# Altium integrated library Connector-SIL-THP.IntLib: 464 symbols (part 1 of 2)
Pins are listed as number, name and electrical type; pins without a type are passive.

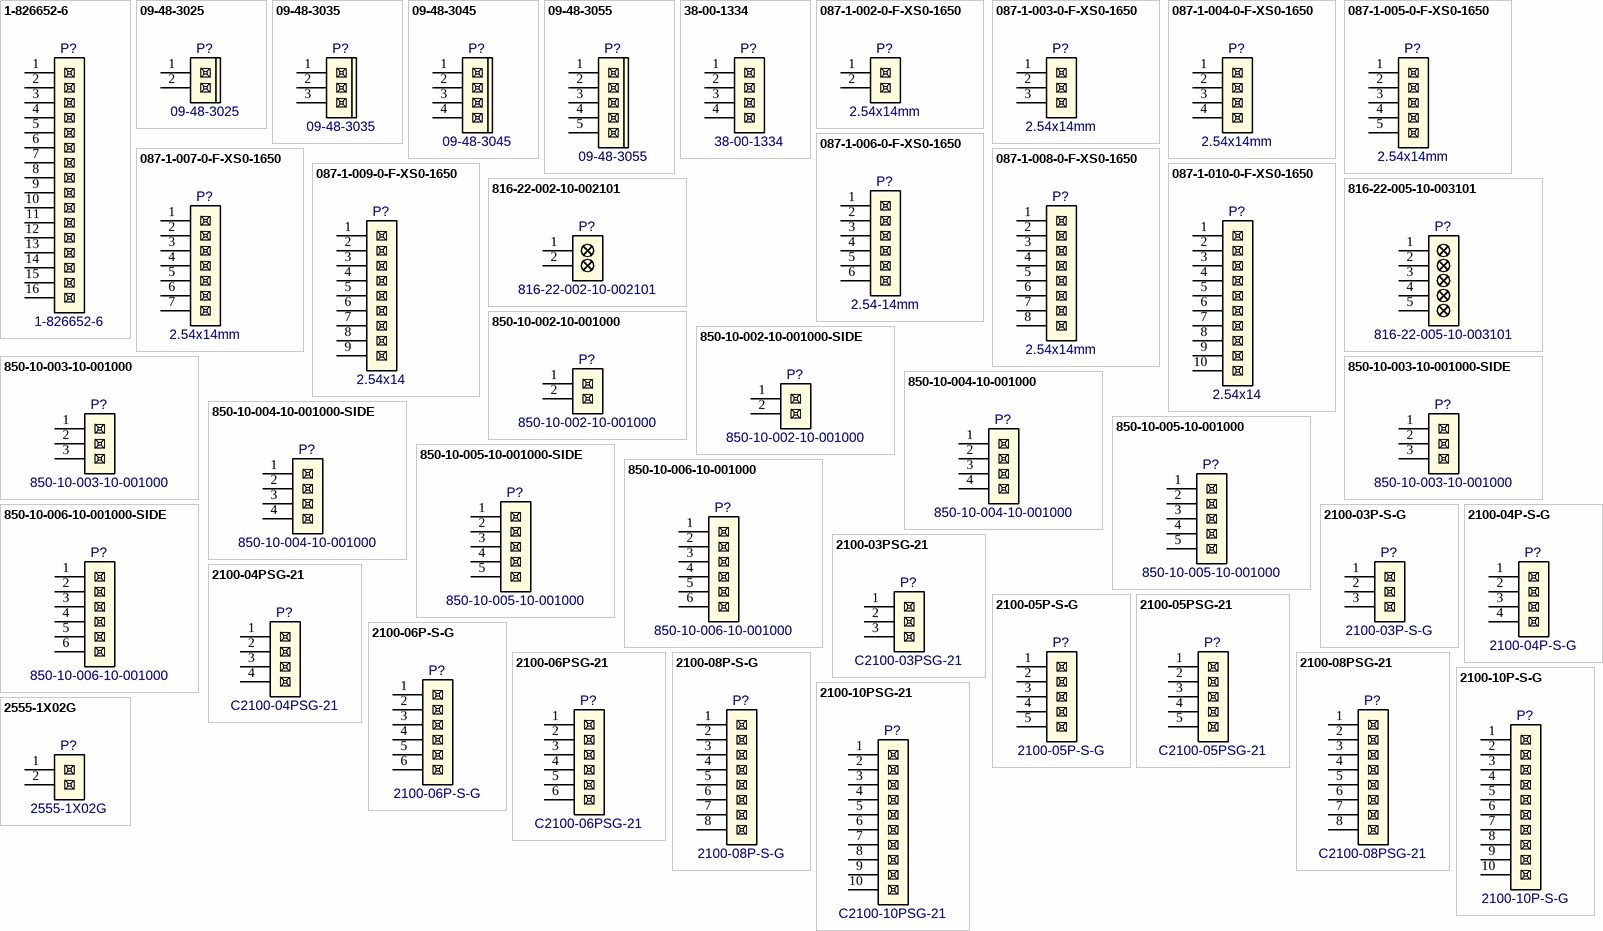
[diagram p0: symbols 1-826652-6 to 2555-1X02G]

## 1-826652-6
designator P?
Header SIL Male THP, 2.54mm Pitch Rt Angle; Manufacturer: Tyco; Package: 1-826652-6; EDM-PN: *; Text2: *; Text1: *; Value: 1-826652-6; SAAB PN: *; Part Number: 1-826652-6
footprint 1-826652-6 (1-826652-6 Rt Angle 2.54mm)
pins: 1, 2, 3, 4, 5, 6, 7, 8, 9, 10, 11, 12, 13, 14, 15, 16

## 09-48-3025
designator P?
Connector Board Edge Rt Angle 3.96mm; Manufacturer: Molex; Package: M41815-02-RT; EDM-PN: *; Text2: *; Text1: *; Part Number: 09-48-3025; SAAB PN: *; Value: 09-48-3025
footprint M41815-02-RT (M41815 3.96mm)
pins: 1, 2

## 09-48-3035
designator P?
Connector Board Edge Rt Angle 3.96mm; Manufacturer: Molex; Package: M41815-03-RT; EDM-PN: *; Text2: *; Text1: *; Part Number: 09-48-3035; Value: 09-48-3035; SAAB PN: *
footprint M41815-03-RT (M41815 3.96mm)
pins: 1, 2, 3

## 09-48-3045
designator P?
Connector Board Edge Rt Angle 3.96mm; Manufacturer: Molex; Package: M41815-04-RT; EDM-PN: *; Text2: *; Text1: *; Part Number: 09-48-3045; SAAB PN: *; Value: 09-48-3045
footprint M41815-04-RT (M41815 3.96mm)
pins: 1, 2, 3, 4

## 09-48-3055
designator P?
Connector Board Edge Rt Angle 3.96mm; Manufacturer: Molex; Package: M41815-05-RT; EDM-PN: *; Text2: *; Text1: *; Part Number: 09-48-3055; SAAB PN: *; Value: 09-48-3055
footprint M41815-05-RT (M41815 3.96mm)
pins: 1, 2, 3, 4, 5

## 38-00-1334
designator P?
Header SIL 2.54mm Rt Angle Cat Ear Terminals; Manufacturer: Molex; Package: 4455-04; EDM-PN: *; Text2: *; Text1: *; Part Number: 38-00-1334; Value: 38-00-1334; SAAB PN: *
footprint 4455-04 (4455-04 10.06x7.9mm)
pins: 1, 2, 3, 4

## 087-1-002-0-F-XS0-1650
designator P?  value 2.54x14mm  (hidden comment: 087-1-002-0-F-XS0-1650)
Header SIL Male THP, 2.54mm Pitch; Manufacturer: MPE-Garry/Actum; EDM-PN: CON1717; Package: SIL2P-2.54-14mm; Text2: *; Text1: *; SAAB PN: *; Part Number: 087-1-002-0-F-XS0-1650
footprint SIL2P-2.54-14mm (SIL Strip 2.54mm)
pins: 1, 2

## 087-1-003-0-F-XS0-1650
designator P?  value 2.54x14mm  (hidden comment: 087-1-003-0-F-XS0-1650)
Header SIL Male THP, 2.54mm Pitch; Manufacturer: MPE-Garry/Actum; EDM-PN: CON1732; Package: SIL3P-2.54-14mm; Text2: *; Text1: *; SAAB PN: *; Part Number: 087-1-003-0-F-XS0-1650
footprint SIL3P-2.54-14mm (SIL Strip 2.54mm)
pins: 1, 2, 3

## 087-1-004-0-F-XS0-1650
designator P?  value 2.54x14mm  (hidden comment: 087-1-004-0-F-XS0-1650)
Header SIL Male THP, 2.54mm Pitch; Manufacturer: MPE-Garry/Actum; Package: SIL4P-2.54-14mm; EDM-PN: *; Text2: *; Text1: *; Part Number: 087-1-004-0-F-XS0-1650; SAAB PN: *
footprint SIL4P-2.54-14mm (SIL Strip 2.54mm)
pins: 1, 2, 3, 4

## 087-1-005-0-F-XS0-1650
designator P?  value 2.54x14mm  (hidden comment: 087-1-005-0-F-XS0-1650)
Header SIL Male THP, 2.54mm Pitch; Manufacturer: MPE-Garry/Actum; Package: SIL5P-2.54-14mm; EDM-PN: *; Text2: *; Text1: *; SAAB PN: *; Part Number: 087-1-005-0-F-XS0-1650
footprint SIL5P-2.54-14mm (SIL Strip 2.54mm)
pins: 1, 2, 3, 4, 5

## 087-1-006-0-F-XS0-1650
designator P?  value 2.54-14mm  (hidden comment: 087-1-006-0-F-XS0-1650)
Header SIL Male THP, 2.54mm Pitch; Manufacturer: MPE-Garry/Actum; Package: SIL6P-2.54-14mm; EDM-PN: *; Text2: *; Text1: *; SAAB PN: *; Part Number: 087-1-006-0-F-XS0-1650
footprint SIL6P-2.54-14mm (SIL Strip 2.54mm)
pins: 1, 2, 3, 4, 5, 6

## 087-1-007-0-F-XS0-1650
designator P?  value 2.54x14mm  (hidden comment: 087-1-007-0-F-XS0-1650)
Header SIL Male THP, 2.54mm Pitch; Manufacturer: MPE-Garry/Actum; Package: SIL7P-2.54-14mm; EDM-PN: *; Text2: *; Text1: *; SAAB PN: *; Part Number: 087-1-007-0-F-XS0-1650
footprint SIL7P-2.54-14mm (SIL Strip 2.54mm)
pins: 1, 2, 3, 4, 5, 6, 7

## 087-1-008-0-F-XS0-1650
designator P?  value 2.54x14mm  (hidden comment: 087-1-008-0-F-XS0-1650)
Header SIL Male THP, 2.54mm Pitch; Manufacturer: MPE-Garry/Actum; Package: SIL8P-2.54-14mm; EDM-PN: *; Text2: *; Text1: *; SAAB PN: *; Part Number: 087-1-008-0-F-XS0-1650
footprint SIL8P-2.54-14mm (SIL Strip 2.54mm)
pins: 1, 2, 3, 4, 5, 6, 7, 8

## 087-1-009-0-F-XS0-1650
designator P?  value 2.54x14  (hidden comment: 087-1-009-0-F-XS0-1650)
Header SIL Male THP, 2.54mm Pitch; Manufacturer: MPE-Garry/Actum; Package: SIL9P-2.54-14; EDM-PN: *; Text2: *; Text1: *; SAAB PN: *; Part Number: 087-1-009-0-F-XS0-1650
footprint SIL9P-2.54-14mm (SIL Strip 2.54mm)
pins: 1, 2, 3, 4, 5, 6, 7, 8, 9

## 087-1-010-0-F-XS0-1650
designator P?  value 2.54x14  (hidden comment: 087-1-010-0-F-XS0-1650)
Header SIL Male THP, 2.54mm Pitch; Manufacturer: MPE-Garry/Actum; Package: SIL10P-2.54-14mm; EDM-PN: *; Text2: *; Text1: *; SAAB PN: *; Part Number: 087-1-010-0-F-XS0-1650
footprint SIL10P-2.54-14mm (SIL Strip 2.54mm)
pins: 1, 2, 3, 4, 5, 6, 7, 8, 9, 10

## 816-22-002-10-002101
designator P?
Connector Spring-Loaded; Manufacturer: Mill-Max; Package: 816-22-002-10-002101; EDM-PN: *; Text2: *; Text1: *; Part Number: 816-22-002-10-002101; SAAB PN: *; Value: 816-22-002-10-002101
footprint 816-22-002-10-002101
pins: 1, 2

## 816-22-005-10-003101
designator P?
Connector Spring-Loaded; Manufacturer: Mill-Max; Package: 816-22-005-10-003101; EDM-PN: *; Text2: *; Text1: *; Part Number: 816-22-005-10-003101; SAAB PN: *; Value: 816-22-005-10-003101
footprint 816-22-005-10-003101 (816-22-005-10-003101 2.54mm)
pins: 1, 2, 3, 4, 5

## 850-10-002-10-001000
designator P?
Header SIL Male THP, 1.27mm Pitch; Manufacturer: Mill-Max; Package: 850-10-002-10-001000; EDM-PN: *; Text2: *; Text1: *; Value: 850-10-002-10-001000; SAAB PN: *; Part Number: 850-10-002-10-001000
footprint 850-10-002-10-001000 (850-10-002-10-001000 1.27mm)
pins: 1, 2

## 850-10-002-10-001000-SIDE
designator P?  Part Number: 850-10-002-10-001000  (hidden comment: 850-10-002-10-001000-SIDE)
Header SIL Male THP, 1.27mm Pitch; Manufacturer: Mill-Max; Package: 850-10-002-10-001000-SIDE; EDM-PN: *; Text2: *; Text1: *; Value: 850-10-002-10-001000; SAAB PN: *
footprint 850-10-002-10-001000-Side (850-10-002-10-001000 1.27mm)
pins: 1, 2

## 850-10-003-10-001000
designator P?
Header SIL Male THP, 1.27mm Pitch; Manufacturer: mill-Max; Package: 850-10-003-10-001000; EDM-PN: *; Text2: *; Text1: *; Value: 850-10-003-10-001000; SAAB PN: *; Part Number: 850-10-003-10-001000
footprint 850-10-003-10-001000 (850-10-003-10-001000 1.27mm)
pins: 1, 2, 3

## 850-10-003-10-001000-SIDE
designator P?  Part Number: 850-10-003-10-001000  (hidden comment: 850-10-003-10-001000-SIDE)
Header SIL Male THP, 1.27mm Pitch; Manufacturer: Mill-Max; Package: 850-10-003-10-001000-SIDE; EDM-PN: *; Text2: *; Text1: *; Value: 850-10-003-10-001000; SAAB PN: *
footprint 850-10-003-10-001000-Side (850-10-003-10-001000 1.27mm)
pins: 1, 2, 3

## 850-10-004-10-001000
designator P?
Header SIL Male THP, 1.27mm Pitch; Manufacturer: Mill-Max; Package: 850-10-004-10-001000; EDM-PN: *; Text2: *; Text1: *; Value: 850-10-004-10-001000; Part Number: 850-10-004-10-001000; SAAB PN: *
footprint 850-10-004-10-001000 (850-10-004-10-001000 1.27mm)
pins: 1, 2, 3, 4

## 850-10-004-10-001000-SIDE
designator P?  Part Number: 850-10-004-10-001000  (hidden comment: 850-10-004-10-001000-SIDE)
Header SIL Male THP, 1.27mm Pitch; Manufacturer: Mill-Max; Package: 850-10-004-10-001000-SIDE; EDM-PN: *; Text2: *; Text1: *; Value: 850-10-004-10-001000; SAAB PN: *
footprint 850-10-004-10-001000-Side (850-10-004-10-001000 1.27mm)
pins: 1, 2, 3, 4

## 850-10-005-10-001000
designator P?
Header SIL Male THP, 1.27mm Pitch; Manufacturer: Mill-Max; Package: 850-10-005-10-001000; EDM-PN: *; Text2: *; Text1: *; Value: 850-10-005-10-001000; SAAB PN: *; Part Number: 850-10-005-10-001000
footprint 850-10-005-10-001000 (850-10-005-10-001000 1.27mm)
pins: 1, 2, 3, 4, 5

## 850-10-005-10-001000-SIDE
designator P?  Part Number: 850-10-005-10-001000  (hidden comment: 850-10-005-10-001000-SIDE)
Header SIL Male THP, 1.27mm Pitch; Manufacturer: Mill-Max; Package: 850-10-005-10-001000-SIDE; EDM-PN: *; Text2: *; Text1: *; Value: 850-10-005-10-001000; SAAB PN: *
footprint 850-10-005-10-001000-Side (850-10-005-10-001000 1.27mm)
pins: 1, 2, 3, 4, 5

## 850-10-006-10-001000
designator P?
Header SIL Male THP, 1.27mm Pitch; Manufacturer: Mill-Max; Package: 850-10-006-10-001000; EDM-PN: *; Text2: *; Text1: *; Value: 850-10-006-10-001000; Part Number: 850-10-006-10-001000; SAAB PN: *
footprint 850-10-006-10-001000 (850-10-006-10-001000 1.27mm)
pins: 1, 2, 3, 4, 5, 6

## 850-10-006-10-001000-SIDE
designator P?  Part Number: 850-10-006-10-001000  (hidden comment: 850-10-006-10-001000-SIDE)
Header SIL Male THP, 1.27mm Pitch; Manufacturer: Mill-Max; Package: 850-10-006-10-001000-SIDE; EDM-PN: *; Text2: *; Text1: *; Value: 850-10-006-10-001000; SAAB PN: *
footprint 850-10-006-10-001000-Side (850-10-006-10-001000 1.27mm)
pins: 1, 2, 3, 4, 5, 6

## 2100-03P-S-G
designator P?
Header SIL Male THP, 2.54mm Pitch; Manufacturer: Vesik; SAAB PN: 1ANA00301AEA; Package: SIL3P-2.54; EDM-PN: *; Text2: *; Text1: *; Value: 2100-03P-S-G; Part Number: 2100-03P-S-G
footprint SIL3P-2.54 (SIL Strip 2.54mm)
pins: 1, 2, 3

## 2100-03PSG-21
designator P?  Part Number: C2100-03PSG-21  (hidden comment: 2100-03PSG-21)
Header SIL Male THP, 2.54mm Pitch; Manufacturer: BVH/Hsuan Mao Technology; Package: 2100-03PSG-21; EDM-PN: *; Text2: *; Text1: *; Value: 2100-03PSG-21; SAAB PN: *
footprint 2100-03PSG-21 (SIL Strip 2.54mm)
pins: 1, 2, 3

## 2100-04P-S-G
designator P?
Header SIL Male THP, 2.54mm Pitch; Manufacturer: Vensik; Package: SIL4P-2.54; EDM-PN: *; Text2: *; Text1: *; Value: 2100-04P-S-G; SAAB PN: *; Part Number: 2100-04P-S-G
footprint SIL4P-2.54 (SIL Strip 2.54mm)
pins: 1, 2, 3, 4

## 2100-04PSG-21
designator P?  Part Number: C2100-04PSG-21  (hidden comment: 2100-04PSG-21)
Header SIL Male THP, 2.54mm Pitch; Manufacturer: BVH/Hsuan Mao Technology; Package: 2100-04PSG-21; EDM-PN: *; Text2: *; Text1: *; Value: 2100-04PSG-21; SAAB PN: *
footprint 2100-04PSG-21 (SIL Strip 2.54mm)
pins: 1, 2, 3, 4

## 2100-05P-S-G
designator P?
Header SIL Male THP, 2.54mm Pitch; Manufacturer: Vensik; Package: SIL5P-2.54; EDM-PN: *; Text2: *; Text1: *; Value: 2100-05P-S-G; SAAB PN: *; Part Number: 2100-05P-S-G
footprint SIL5P-2.54 (SIL Strip 2.54mm)
pins: 1, 2, 3, 4, 5

## 2100-05PSG-21
designator P?  Part Number: C2100-05PSG-21  (hidden comment: 2100-05PSG-21)
Header SIL Male THP, 2.54mm Pitch; Manufacturer: BVH/Hsuan Mao Technology; Package: 2100-05PSG-21; EDM-PN: *; Text2: *; Text1: *; Value: 2100-05PSG-21; SAAB PN: *
footprint 2100-05PSG-21 (SIL Strip 2.54mm)
pins: 1, 2, 3, 4, 5

## 2100-06P-S-G
designator P?
Header SIL Male THP, 2.54mm Pitch; Manufacturer: Vensik; Package: SIL6P-2.54; EDM-PN: *; Text2: *; Text1: *; Value: 2100-06P-S-G; SAAB PN: *; Part Number: 2100-06P-S-G
footprint SIL6P-2.54 (SIL Strip 2.54mm)
pins: 1, 2, 3, 4, 5, 6

## 2100-06PSG-21
designator P?  Part Number: C2100-06PSG-21  (hidden comment: 2100-06PSG-21)
Header SIL Male THP, 2.54mm Pitch; Manufacturer: BVH/Hsuan Mao Technology; Package: 2100-06PSG-21; EDM-PN: *; Text2: *; Text1: *; Value: 2100-06PSG-21; SAAB PN: *
footprint 2100-06PSG-21 (SIL Strip 2.54mm)
pins: 1, 2, 3, 4, 5, 6

## 2100-08P-S-G
designator P?
Header SIL Male THP, 2.54mm Pitch; Manufacturer: Vensik; Package: SIL8P-2.54; EDM-PN: *; Text2: *; Text1: *; Value: 2100-08P-S-G; SAAB PN: *; Part Number: 2100-08P-S-G
footprint SIL8P-2.54 (SIL Strip 2.54mm)
pins: 1, 2, 3, 4, 5, 6, 7, 8

## 2100-08PSG-21
designator P?  Part Number: C2100-08PSG-21  (hidden comment: 2100-08PSG-21)
Header SIL Male THP, 2.54mm Pitch; Manufacturer: BVH/Hsuan Mao Technology; Package: 2100-08PSG-21; EDM-PN: *; Text2: *; Text1: *; Value: 2100-08PSG-21; SAAB PN: *
footprint 2100-08PSG-21 (SIL Strip 2.54mm)
pins: 1, 2, 3, 4, 5, 6, 7, 8

## 2100-10P-S-G
designator P?
Header SIL Male THP, 2.54mm Pitch; Manufacturer: Vensik; Package: SIL10P-2.54; EDM-PN: *; Text2: *; Text1: *; Value: 2100-10P-S-G; SAAB PN: *; Part Number: 2100-10P-S-G
footprint SIL10P-2.54 (SIL Strip 2.54mm)
pins: 1, 2, 3, 4, 5, 6, 7, 8, 9, 10

## 2100-10PSG-21
designator P?  Part Number: C2100-10PSG-21  (hidden comment: 2100-10PSG-21)
Header SIL Male THP, 2.54mm Pitch; Manufacturer: BVH/Hsuan Mao Technology; Package: 2100-10PSG-21; EDM-PN: *; Text2: *; Text1: *; Value: 2100-10PSG-21; SAAB PN: *
footprint 2100-10PSG-21 (SIL Strip 2.54mm)
pins: 1, 2, 3, 4, 5, 6, 7, 8, 9, 10

## 2555-1X02G
designator P?
Header SIL 2.54mm Female Rt Angle; Manufacturer: Ho Chien; Package: 2555-1X02G; EDM-PN: *; Text2: *; Text1: *; Part Number: 2555-1X02G; SAAB PN: *; Value: 2555-1X02G
footprint 2555-1X02G (2555-1X02G 5.08x8.5mm 2.54mm)
pins: 1, 2

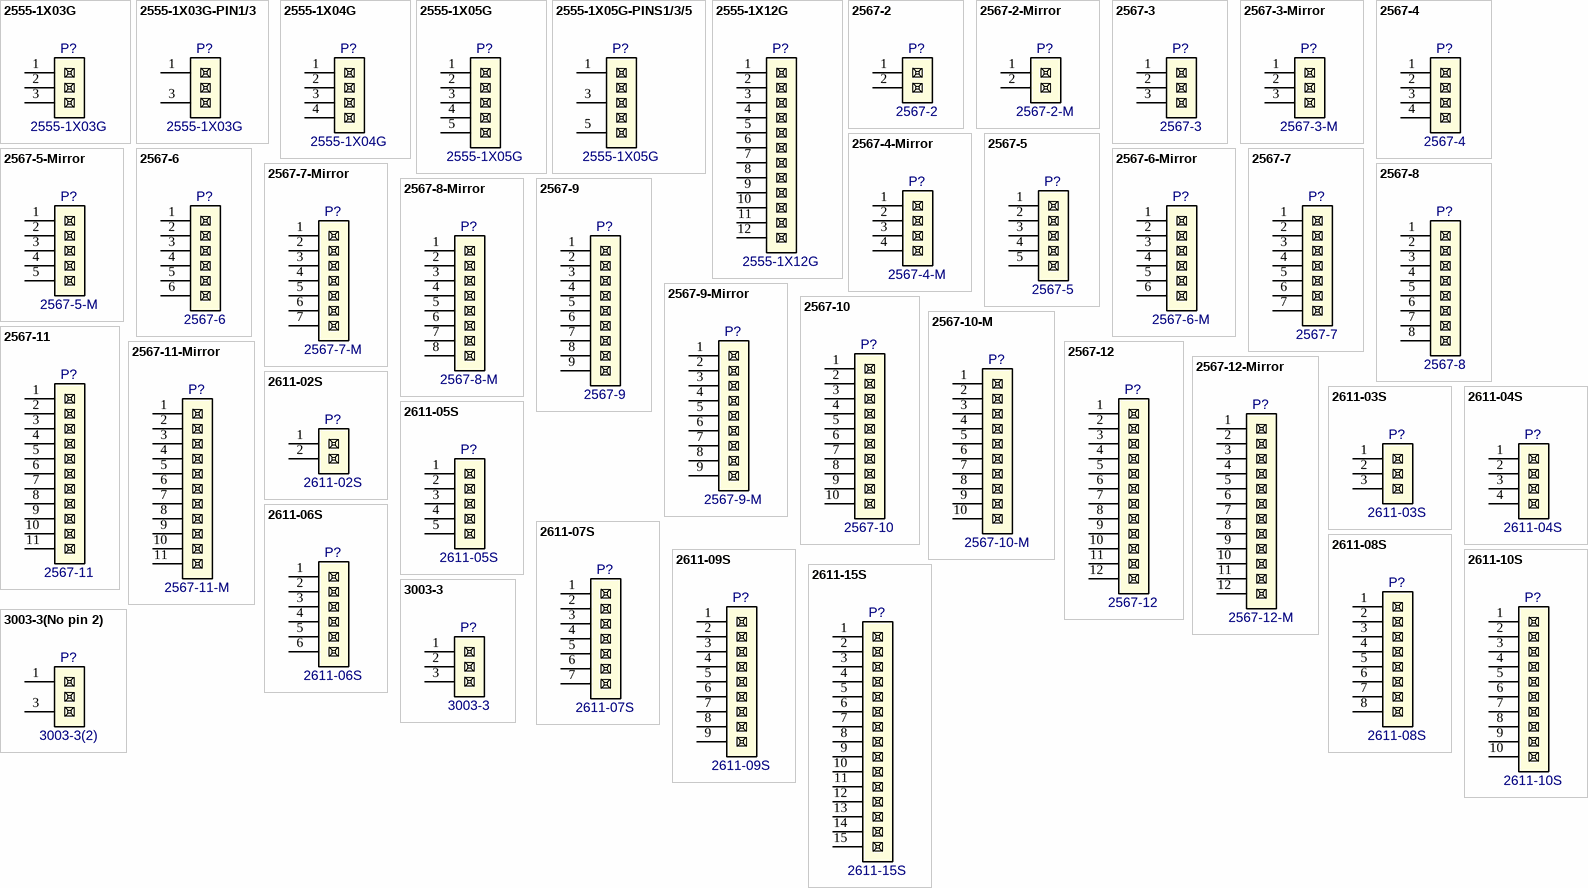
[diagram p1: symbols 2555-1X03G to 3003-3(No pin 2)]

## 2555-1X03G
designator P?
Header SIL 2.54mm Female Rt Angle; Manufacturer: Ho Chien; Package: 2555-1X03G; EDM-PN: *; Text2: *; Text1: *; Part Number: 2555-1X03G; SAAB PN: *; Value: 2555-1X03G
footprint 2555-1X03G (2555-1X03G 7.62x8.5mm 2.54mm)
pins: 1, 2, 3

## 2555-1X03G-PIN1/3
designator P?, comment 2555-1X03G
Header SIL 2.54mm Female Rt Angle; Manufacturer: Ho Chien; Package: 2555-1X03G-13; EDM-PN: *; Text2: *; Text1: *; Part Number: 2555-1X03G; SAAB PN: *; Value: 2555-1X03G
footprint 2555-1X03G-13 (2555-1X03G 7.62x8.5mm 2.54mm)
pins: 1, 3

## 2555-1X04G
designator P?
Header SIL 2.54mm Female Rt Angle; Manufacturer: Ho Chien; Package: 2555-1X04G; EDM-PN: *; Text2: *; Text1: *; Part Number: 2555-1X04G; SAAB PN: *; Value: 2555-1X04G
footprint 2555-1X04G (2555-1X04G 10.16x8.5mm 2.54mm)
pins: 1, 2, 3, 4

## 2555-1X05G
designator P?
Header SIL 2.54mm Female Rt Angle; Manufacturer: Ho Chien; Package: 2555-1X05G; EDM-PN: *; Text2: *; Text1: *; Part Number: 2555-1X05G; SAAB PN: *; Value: 2555-1X05G
footprint 2555-1x05G (2555-1x05G 12.7x8.5mm 2.54mm)
pins: 1, 2, 3, 4, 5

## 2555-1X05G-PINS1/3/5
designator P?, comment 2555-1X05G
Header SIL 2.54mm Female Rt Angle; Manufacturer: Ho Chien; Package: 2555-1X05G-135; EDM-PN: *; Text2: *; Text1: *; Part Number: 2555-1X05G; SAAB PN: *; Value: 2555-1X05G
footprint 2555-1x05G-135 (2555-1x05G 12.7x8.5mm 2.54mm)
pins: 1, 3, 5

## 2555-1X12G
designator P?
Header SIL 2.54mm Female Rt Angle; Manufacturer: Ho Chien; Package: 2555-1X12G; EDM-PN: *; Text2: *; Text1: *; Part Number: 2555-1X12G; SAAB PN: *; Value: 2555-1X12G
footprint 2555-1x12G (2555-1x12G 2.54mm)
pins: 1, 2, 3, 4, 5, 6, 7, 8, 9, 10, 11, 12

## 2567-2
designator P?
Header SIL 2.54mm Rt Angle Low Profile; Manufacturer: Connector Tech; Package: 2567-2; EDM-PN: *; Text2: *; Text1: *; Part Number: 2567-2; SAAB PN: *; Value: 2567-2
footprint 2567-2 (SIL Male Rt Angle THP Header, 2.54mm Pitch)
pins: 1, 2

## 2567-2-Mirror
designator P?, comment 2567-2-M
Header SIL 2.54mm Rt Angle Low Profile; Manufacturer: Connector Tech; Part Number: 2567-2; Package: 2567-2-M; EDM-PN: *; Text2: *; Text1: *; SAAB PN: *; Value: 2567-2-M
footprint 2567-2-M (SIL Male Rt Angle THP Header, 2.54mm Pitch)
pins: 1, 2

## 2567-3
designator P?
Header SIL 2.54mm Rt Angle Low Profile; Manufacturer: Connector Tech; Package: 2567-3; EDM-PN: *; Text2: *; Text1: *; Part Number: 2567-3; SAAB PN: *; Value: 2567-3
footprint 2567-3 (SIL Male Rt Angle THP Header, 2.54mm Pitch)
pins: 1, 2, 3

## 2567-3-Mirror
designator P?, comment 2567-3-M
Header SIL 2.54mm Rt Angle Low Profile; Manufacturer: Connector Tech; Part Number: 2567-3; Package: 2567-3-M; EDM-PN: *; Text2: *; Text1: *; Value: 2567-3-M; SAAB PN: *
footprint 2567-3-M (SIL Male Rt Angle THP Header, 2.54mm Pitch)
pins: 1, 2, 3

## 2567-4
designator P?
Header SIL 2.54mm Rt Angle Low Profile; Manufacturer: Connector Tech; Package: 2567-4; EDM-PN: *; Text2: *; Text1: *; Part Number: 2567-4; SAAB PN: *; Value: 2567-4
footprint 2567-4 (SIL Male Rt Angle THP Header, 2.54mm Pitch)
pins: 1, 2, 3, 4

## 2567-4-Mirror
designator P?, comment 2567-4-M
Header SIL 2.54mm Rt Angle Low Profile; Manufacturer: Connector Tech; Part Number: 2567-4; Package: 2567-4-M; EDM-PN: *; Text2: *; Text1: *; Value: 2567-4-M; SAAB PN: *
footprint 2567-4-M (SIL Male Rt Angle THP Header, 2.54mm Pitch)
pins: 1, 2, 3, 4

## 2567-5
designator P?
Header SIL 2.54mm Rt Angle Low Profile; Manufacturer: Connector Tech; Package: 2567-5; EDM-PN: *; Text2: *; Text1: *; Part Number: 2567-5; Value: 2567-5; SAAB PN: *
footprint 2567-5 (SIL Male Rt Angle THP Header, 2.54mm Pitch)
pins: 1, 2, 3, 4, 5

## 2567-5-Mirror
designator P?, comment 2567-5-M
Header SIL 2.54mm Rt Angle Low Profile; Manufacturer: Connector Tech; Part Number: 2567-5; Package: 2567-5-M; EDM-PN: *; Text2: *; Text1: *; Value: 2567-5-M; SAAB PN: *
footprint 2567-5-M (SIL Male Rt Angle THP Header, 2.54mm Pitch)
pins: 1, 2, 3, 4, 5

## 2567-6
designator P?
Header SIL 2.54mm Rt Angle Low Profile; Manufacturer: Connector Tech; Package: 2567-6; EDM-PN: *; Text2: *; Text1: *; Part Number: 2567-6; Value: 2567-6; SAAB PN: *
footprint 2567-6 (SIL Male Rt Angle THP Header, 2.54mm Pitch)
pins: 1, 2, 3, 4, 5, 6

## 2567-6-Mirror
designator P?, comment 2567-6-M
Header SIL 2.54mm Rt Angle Low Profile; Manufacturer: Connector Tech; Part Number: 2567-6; Package: 2567-6-M; EDM-PN: *; Text2: *; Text1: *; Value: 2567-6-M; SAAB PN: *
footprint 2567-6-M (SIL Male Rt Angle THP Header, 2.54mm Pitch)
pins: 1, 2, 3, 4, 5, 6

## 2567-7
designator P?
Header SIL 2.54mm Rt Angle Low Profile; Manufacturer: Connector Tech; Package: 2567-7; EDM-PN: *; Text2: *; Text1: *; Part Number: 2567-7; Value: 2567-7; SAAB PN: *
footprint 2567-7 (SIL Male Rt Angle THP Header, 2.54mm Pitch)
pins: 1, 2, 3, 4, 5, 6, 7

## 2567-7-Mirror
designator P?, comment 2567-7-M
Header SIL 2.54mm Rt Angle Low Profile; Manufacturer: Connector Tech; Part Number: 2567-7; Package: 2567-7-M; EDM-PN: *; Text2: *; Text1: *; Value: 2567-7-M; SAAB PN: *
footprint 2567-7-M (SIL Male Rt Angle THP Header, 2.54mm Pitch)
pins: 1, 2, 3, 4, 5, 6, 7

## 2567-8
designator P?
Header SIL 2.54mm Rt Angle Low Profile; Manufacturer: Connector Tech; Package: 2567-8; EDM-PN: *; Text2: *; Text1: *; Part Number: 2567-8; Value: 2567-8; SAAB PN: *
footprint 2567-8 (SIL Male Rt Angle THP Header, 2.54mm Pitch)
pins: 1, 2, 3, 4, 5, 6, 7, 8

## 2567-8-Mirror
designator P?, comment 2567-8-M
Header SIL 2.54mm Rt Angle Low Profile; Manufacturer: Connector Tech; Part Number: 2567-8; Package: 2567-8-M; EDM-PN: *; Text2: *; Text1: *; Value: 2567-8-M; SAAB PN: *
footprint 2567-8-M (SIL Male Rt Angle THP Header, 2.54mm Pitch)
pins: 1, 2, 3, 4, 5, 6, 7, 8

## 2567-9
designator P?
Header SIL 2.54mm Rt Angle Low Profile; Manufacturer: Connector Tech; Package: 2567-9; EDM-PN: *; Text2: *; Text1: *; Part Number: 2567-9; Value: 2567-9; SAAB PN: *
footprint 2567-9 (SIL Male Rt Angle THP Header, 2.54mm Pitch)
pins: 1, 2, 3, 4, 5, 6, 7, 8, 9

## 2567-9-Mirror
designator P?, comment 2567-9-M
Header SIL 2.54mm Rt Angle Low Profile; Manufacturer: Connector Tech; Part Number: 2567-9; Package: 2567-9-M; EDM-PN: *; Text2: *; Text1: *; SAAB PN: *; Value: 2567-9-M
footprint 2567-9-M (SIL Male Rt Angle THP Header, 2.54mm Pitch)
pins: 1, 2, 3, 4, 5, 6, 7, 8, 9

## 2567-10
designator P?
Header SIL 2.54mm Rt Angle Low Profile; Manufacturer: Connector Tech; Package: 2567-10; EDM-PN: *; Text2: *; Text1: *; Part Number: 2567-10; Value: 2567-10; SAAB PN: *
footprint 2567-10 (SIL Male Rt Angle THP Header, 2.54mm Pitch)
pins: 1, 2, 3, 4, 5, 6, 7, 8, 9, 10

## 2567-10-M
designator P?
Header SIL 2.54mm Rt Angle Low Profile; Manufacturer: Connector Tech; Package: 2567-10-M; EDM-PN: *; Text2: *; Text1: *; Part Number: 2567-10; Value: 2567-10-M; SAAB PN: *
footprint 2567-10-M (SIL Male Rt Angle THP Header, 2.54mm Pitch)
pins: 1, 2, 3, 4, 5, 6, 7, 8, 9, 10

## 2567-11
designator P?
Header SIL 2.54mm Rt Angle Low Profile; Manufacturer: Connector Tech; Package: 2567-11; EDM-PN: *; Text2: *; Text1: *; Part Number: 2567-11; Value: 2567-11; SAAB PN: *
footprint 2567-11 (SIL Male Rt Angle THP Header, 2.54mm Pitch)
pins: 1, 2, 3, 4, 5, 6, 7, 8, 9, 10, 11

## 2567-11-Mirror
designator P?, comment 2567-11-M
Header SIL 2.54mm Rt Angle Low Profile; Manufacturer: Connector Tech; Package: 2567-11-M; EDM-PN: *; Text2: *; Text1: *; Part Number: 2567-11; Value: 2567-11-M; SAAB PN: *
footprint 2567-11-M (SIL Male Rt Angle THP Header, 2.54mm Pitch)
pins: 1, 2, 3, 4, 5, 6, 7, 8, 9, 10, 11

## 2567-12
designator P?
Header SIL 2.54mm Rt Angle Low Profile; Manufacturer: Connector Tech; EDM-PN: CON576; Package: 2567-12; Text2: *; Text1: *; Part Number: 2567-12; Value: 2567-12; SAAB PN: *
footprint 2567-12 (SIL Male Rt Angle THP Header, 2.54mm Pitch)
pins: 1, 2, 3, 4, 5, 6, 7, 8, 9, 10, 11, 12

## 2567-12-Mirror
designator P?, comment 2567-12-M
Header SIL 2.54mm Rt Angle Low Profile; Manufacturer: Connector Tech; EDM-PN: CON576; Package: 2567-12-M; Text2: *; Text1: *; Part Number: 2567-12; Value: 2567-12-M; SAAB PN: *
footprint 2567-12-M (SIL Male Rt Angle THP Header, 2.54mm Pitch)
pins: 1, 2, 3, 4, 5, 6, 7, 8, 9, 10, 11, 12

## 2611-02S
designator P?
Header SIL Female 2.54mm Bottom Entry; Manufacturer: Connector Tech; Package: 2611-02S; EDM-PN: *; Text2: *; Text1: *; Value: 2611-02S; SAAB PN: *; Part Number: 2611-02S
footprint 2611-02S (SIL Female 2.54mm Bottom Entry)
pins: 1, 2

## 2611-03S
designator P?
Header SIL Female 2.54mm Bottom Entry; Manufacturer: Connector Tech; Package: 2611-03S; EDM-PN: *; Text2: *; Text1: *; Value: 2611-03S; SAAB PN: *; Part Number: 2611-03S
footprint 2611-03S (SIL Female 2.54mm Bottom Entry)
pins: 1, 2, 3

## 2611-04S
designator P?
Header SIL Female 2.54mm Bottom Entry; Manufacturer: Connector Tech; EDM-PN: CON1767; Package: 2611-04S; Text2: *; Text1: *; Value: 2611-04S; SAAB PN: *; Part Number: 2611-04S
footprint 2611-04S (SIL Female 2.54mm Bottom Entry)
pins: 1, 2, 3, 4

## 2611-05S
designator P?
Header SIL Female 2.54mm Bottom Entry; Manufacturer: Connector Tech; Package: 2611-05S; EDM-PN: *; Text2: *; Text1: *; Value: 2611-05S; SAAB PN: *; Part Number: 2611-05S
footprint 2611-05S (SIL Female 2.54mm Bottom Entry)
pins: 1, 2, 3, 4, 5

## 2611-06S
designator P?
Header SIL Female 2.54mm Bottom Entry; Manufacturer: Connector Tech; Package: 2611-06S; EDM-PN: *; Text2: *; Text1: *; Value: 2611-06S; SAAB PN: *; Part Number: 2611-06S
footprint 2611-06S (SIL Female 2.54mm Bottom Entry)
pins: 1, 2, 3, 4, 5, 6

## 2611-07S
designator P?
Header SIL Female 2.54mm Bottom Entry; Manufacturer: Connector Tech; EDM-PN: CON1768; Package: 2611-07S; Text2: *; Text1: *; Value: 2611-07S; SAAB PN: *; Part Number: 2611-07S
footprint 2611-07S (SIL Female 2.54mm Bottom Entry)
pins: 1, 2, 3, 4, 5, 6, 7

## 2611-08S
designator P?
Header SIL Female 2.54mm Bottom Entry; Manufacturer: Connector Tech; Package: 2611-08S; EDM-PN: *; Text2: *; Text1: *; Value: 2611-08S; SAAB PN: *; Part Number: 2611-08S
footprint 2611-08S (SIL Female 2.54mm Bottom Entry)
pins: 1, 2, 3, 4, 5, 6, 7, 8

## 2611-09S
designator P?
Header SIL Female 2.54mm Bottom Entry; Manufacturer: Connector Tech; Package: 2611-09S; EDM-PN: *; Text2: *; Text1: *; Value: 2611-09S; SAAB PN: *; Part Number: 2611-09S
footprint 2611-09S (SIL Female 2.54mm Bottom Entry)
pins: 1, 2, 3, 4, 5, 6, 7, 8, 9

## 2611-10S
designator P?
Header SIL Female 2.54mm Bottom Entry; Manufacturer: Connector Tech; Package: 2611-10S; EDM-PN: *; Text2: *; Text1: *; Value: 2611-10S; SAAB PN: *; Part Number: 2611-10S
footprint 2611-10S (SIL Female 2.54mm Bottom Entry)
pins: 1, 2, 3, 4, 5, 6, 7, 8, 9, 10

## 2611-15S
designator P?
Header SIL Female 2.54mm Bottom Entry; Manufacturer: Connector Tech; Package: 2611-15S; EDM-PN: *; Text2: *; Text1: *; Value: 2611-15S; SAAB PN: *; Part Number: 2611-15S
footprint 2611-15S (SIL Female 2.54mm Bottom Entry)
pins: 1, 2, 3, 4, 5, 6, 7, 8, 9, 10, 11, 12, 13, 14, 15

## 3003-3
designator P?
Header SIL Male THP, 5.08mm Pitch; Manufacturer: Molex; Package: SIL3P-5.08; EDM-PN: *; Text2: *; Text1: *; Part Number: 10-08-1031; Value: 3003-3; SAAB PN: *
footprint SIL3P-5.08
pins: 1, 2, 3

## 3003-3(No pin 2)
designator P?  value 3003-3(2)  (hidden comment: 3003-3(No pin 2))
Header SIL Male THP, 5.08mm Pitch (Pin 2 removed); Manufacturer: Molex; Package: SIL3P-5.08(No Pin 2); EDM-PN: *; Text2: *; Text1: *; Part Number: 10-08-1031; SAAB PN: *
footprint SIL3P-5.08(No Pin 2) (SIL3P-5.08)
pins: 1, 3

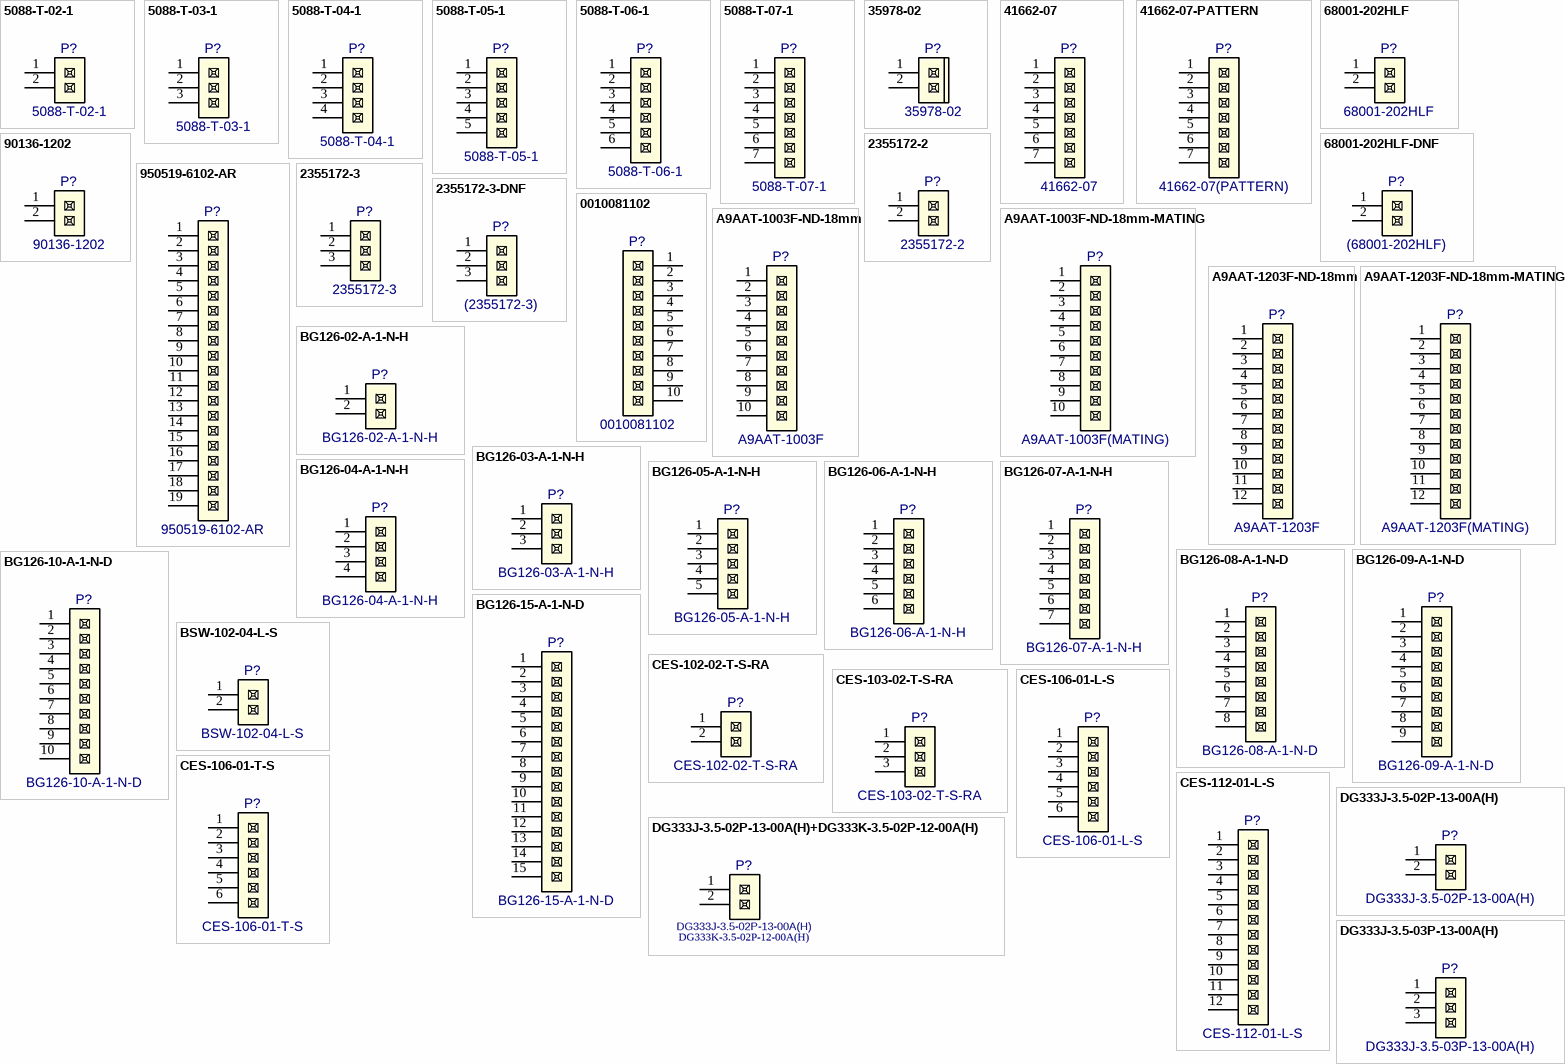
[diagram p2: symbols 5088-T-02-1 to DG333J-3.5-03P-13-00A(H)]

## 5088-T-02-1
designator P?
Header SIL Male THP, 5.08mm Pitch Rt Angle; Manufacturer: Conexcon; Package: SIL2PR-5.08; EDM-PN: *; Text2: *; Text1: *; Value: 5088-T-02-1; Part Number: 5088-T-02-1; SAAB PN: *
footprint SIL2PR-5.08
pins: 1, 2

## 5088-T-03-1
designator P?
Header SIL Male THP, 5.08mm Pitch Rt Angle; Manufacturer: Conexcon; Package: SIL3PR-5.08; EDM-PN: *; Text2: *; Text1: *; Value: 5088-T-03-1; Part Number: 5088-T-03-1; SAAB PN: *
footprint SIL3PR-5.08
pins: 1, 2, 3

## 5088-T-04-1
designator P?
Header SIL Male THP, 5.08mm Pitch Rt Angle; Manufacturer: Conexcon; Package: SIL4PR-5.08; EDM-PN: *; Text2: *; Text1: *; Value: 5088-T-04-1; Part Number: 5088-T-04-1; SAAB PN: *
footprint SIL4PR-5.08
pins: 1, 2, 3, 4

## 5088-T-05-1
designator P?
Header SIL Male THP, 5.08mm Pitch Rt Angle; Manufacturer: Conexcon; Package: SIL5PR-5.08; EDM-PN: *; Text2: *; Text1: *; Value: 5088-T-05-1; Part Number: 5088-T-05-1; SAAB PN: *
footprint SIL5PR-5.08
pins: 1, 2, 3, 4, 5

## 5088-T-06-1
designator P?
Header SIL Male THP, 5.08mm Pitch Rt Angle; Manufacturer: Conexcon; Package: SIL6PR-5.08; EDM-PN: *; Text2: *; Text1: *; Value: 5088-T-06-1; Part Number: 5088-T-06-1; SAAB PN: *
footprint SIL6PR-5.08
pins: 1, 2, 3, 4, 5, 6

## 5088-T-07-1
designator P?
Header SIL Male THP, 5.08mm Pitch Rt Angle; Manufacturer: Conexcon; Package: SIL7PR-5.08; EDM-PN: *; Text2: *; Text1: *; Value: 5088-T-07-1; SAAB PN: *; Part Number: 5088-T-07-1
footprint SIL7PR-5.08
pins: 1, 2, 3, 4, 5, 6, 7

## 35978-02
designator P?
Header SIL with Lock; Manufacturer: Molex; Part Number: 359780210; Package: 35978-2; EDM-PN: *; Text2: *; Text1: *; Value: 35978-02; SAAB PN: *
footprint M35978-2 (Header Positive Lock 3.96 7.92x8.0mm)
pins: 1, 2

## 41662-07
designator P?
Header SIL 3.96mm Rt Angle Low; Manufacturer: Molex; Package: 41662-07; EDM-PN: *; Text2: *; Text1: *; Part Number: 41662-07; Value: 41662-07; SAAB PN: *
footprint 41662-07 (41662-07 3.96mm)
pins: 1, 2, 3, 4, 5, 6, 7

## 41662-07-PATTERN
designator P?  value 41662-07(PATTERN)  (hidden comment: 41662-07-PATTERN)  (no BOM)
Header SIL 3.96mm Rt Angle (Pattern Only); Manufacturer: Molex; Package: 41662-07-PATTERN; EDM-PN: *; Text2: *; Text1: *; Part Number: 41662-07-PATTERN; SAAB PN: *
footprint 41662-07-PATTERN (41662-07 Pattern 3.96mm)
pins: 1, 2, 3, 4, 5, 6, 7

## 68001-202HLF
designator P?
SIL Male Straight THP Header, 2.54mm Pitch; Manufacturer: FCI; Package: HDR1X2MS2.54THP; EDM-PN: *; Text2: *; Text1: *; Value: 68001-202HLF; Part Number: 68001-202HLF; SAAB PN: *
footprint HDR1X2MS2.54THP (SIL Male Straight THP Header, 2.54mm Pitch)
pins: 1, 2

## 68001-202HLF-DNF
designator P?  value (68001-202HLF)  (hidden comment: 68001-202HLF-DNF)
SIL Male Straight THP Header, 2.54mm Pitch - Do not Fit; Manufacturer: FCI; Part Number: DNF - 68001-202HLF; Package: HDR1X2MS2.54THP; EDM-PN: *; Text2: *; Text1: *; SAAB PN: *
footprint HDR1X2MS2.54THP (SIL Male Straight THP Header, 2.54mm Pitch)
pins: 1, 2

## 90136-1202
designator P?
Header SIL Male THP, 2.54mm Pitch; Manufacturer: Molex; Package: SIL2P-2.54; EDM-PN: *; Text2: *; Text1: *; Value: 90136-1202; Part Number: 90136-1202; SAAB PN: *
footprint SIL2P-2.54 (SIL Strip 2.54mm)
pins: 1, 2

## 950519-6102-AR
designator P?
Header SIL Female THP, 2.00mm Pitch; Manufacturer: 3M; Package: SIL19S-2.00; EDM-PN: *; Text2: *; Text1: *; Value: 950519-6102-AR; Part Number: 950519-6102-AR; SAAB PN: *
footprint SIL19S-2.00 (SIL Female 2.00mm)
pins: 1, 2, 3, 4, 5, 6, 7, 8, 9, 10, 11, 12, 13, 14, 15, 16, 17, 18, 19

## 2355172-2
designator P?
Header SIL Male THP, 2.00mm Pitch; Manufacturer: TE Connectivity; Package: SIL2P-2.00; EDM-PN: *; Text2: *; Text1: *; Value: 2355172-2; SAAB PN: *; Part Number: 2355172-2
footprint SIL2P-2.00 (SIL2P 4.0x2.0mm)
pins: 1, 2

## 2355172-3
designator P?
Header SIL Male THP, 2.00mm Pitch; Manufacturer: Te Connectivity; Package: SIL3P-2.00; EDM-PN: *; Text2: *; Text1: *; Value: 2355172-3; SAAB PN: *; Part Number: 2355172-3
footprint SIL3P-2.00 (SIL3P 6.0x2.0mm)
pins: 1, 2, 3

## 2355172-3-DNF
designator P?, comment value (2355172-3)  (hidden comment: 2355172-3)
Header SIL Male THP, 2.00mm Pitch - Do not Fit; Manufacturer: Te Connectivity; Part Number: DNF-  2355172-3; Package: SIL3P-2.00; EDM-PN: *; Text2: *; Text1: *; SAAB PN: *
footprint SIL3P-2.00 (SIL3P 6.0x2.0mm)
pins: 1, 2, 3

## 0010081102
designator P?
Header SIL Male THP, 5.08mm Pitch; Manufacturer: Molex; Package: 0010081102; EDM-PN: *; Text2: *; Text1: *; Value: 0010081102; SAAB PN: *; Part Number: 0010081102
footprint 0010081102 (0010081102 5.08mm)
pins: 1, 2, 3, 4, 5, 6, 7, 8, 9, 10

## A9AAT-1003F-ND-18mm
designator P?  value A9AAT-1003F  (hidden comment: A9AAT-1003F-ND-18mm)
Flexcable and Pins 76.2mm x 10Way; Manufacturer: Digikey (Tyco); Package: A9AAT-1003F-ND-18mm; EDM-PN: *; Text2: *; Text1: *; Part Number: A9AAT-1003F-ND; SAAB PN: *
footprint A9AAt-1003F-ND-18mm (A9AAT-1003F-ND 76.2x33.0mm)
pins: 1, 2, 3, 4, 5, 6, 7, 8, 9, 10

## A9AAT-1003F-ND-18mm-MATING
designator P?  value A9AAT-1003F(MATING)  (hidden comment: A9AAT-1003F-ND-18mm-MATING)  (no BOM)
Flexcable and Pins (Pattern only); Manufacturer: Digikey (Tyco); Part Number: MATING for A9AAT-1003F-ND; Package: A9AAT-1003F-ND-18mm-REV; EDM-PN: *; Text2: *; Text1: *; SAAB PN: *
footprint A9AAt-1003F-ND-18mm-REV (A9AAt-1003F-ND 76.2x33.0mm)
pins: 1, 2, 3, 4, 5, 6, 7, 8, 9, 10

## A9AAT-1203F-ND-18mm
designator P?  value A9AAT-1203F  (hidden comment: A9AAT-1203F-ND-18mm)
Flexcable and Pins 76.2mm x 12Way; Manufacturer: Digikey (Tyco); Package: A9AAT-1203F-ND-18mm; EDM-PN: *; Text2: *; Text1: *; Part Number: A9AAT-1203F-ND; SAAB PN: *
footprint A9AAT-1203F-ND-18mm (A9AAt-1203F-ND 76.2x33.0mm)
pins: 1, 2, 3, 4, 5, 6, 7, 8, 9, 10, 11, 12

## A9AAT-1203F-ND-18mm-MATING
designator P?  value A9AAT-1203F(MATING)  (hidden comment: A9AAT-1203F-ND-18mm-MATING)  (no BOM)
Flexcable and Pins (Pattern only); Manufacturer: Digikey (Tyco); Part Number: MATING for A9AAT-1203F-ND; Package: A9AAT-1203F-ND-18mm-REV; EDM-PN: *; Text2: *; Text1: *; SAAB PN: *
footprint A9AAT-1203F-ND-18mm-REV (A9AAt-1203F-ND 76.2x33.0mm)
pins: 1, 2, 3, 4, 5, 6, 7, 8, 9, 10, 11, 12

## BG126-02-A-1-N-H
designator P?
Header SIL Female 2.54mm Bottom Entry; Manufacturer: GCT; Package: BG126-02-A-1-N-H; EDM-PN: *; Text2: *; Text1: *; Value: BG126-02-A-1-N-H; SAAB PN: *; Part Number: BG126-02-A-1-N-H
footprint BG126-02-A-1-N (SIL Female 2.54mm Bottom Entry)
pins: 1, 2

## BG126-03-A-1-N-H
designator P?
Header SIL Female 2.54mm Bottom Entry; Manufacturer: GCT; Package: BG126-03-A-1-N-H; EDM-PN: *; Text2: *; Text1: *; Value: BG126-03-A-1-N-H; SAAB PN: *; Part Number: BG126-03-A-1-N-H
footprint BG126-03-A-1-N (SIL Female 2.54mm Bottom Entry)
pins: 1, 2, 3

## BG126-04-A-1-N-H
designator P?
Header SIL Female 2.54mm Bottom Entry; Manufacturer: GCT; Package: BG126-04-A-1-N-H; EDM-PN: *; Text2: *; Text1: *; Value: BG126-04-A-1-N-H; SAAB PN: *; Part Number: BG126-04-A-1-N-H
footprint BG126-04-A-1-N (SIL Female 2.54mm Bottom Entry)
pins: 1, 2, 3, 4

## BG126-05-A-1-N-H
designator P?
Header SIL Female 2.54mm Bottom Entry; Manufacturer: GCT; Package: BG126-05-A-1-N-H; EDM-PN: *; Text2: *; Text1: *; Value: BG126-05-A-1-N-H; SAAB PN: *; Part Number: BG126-05-A-1-N-H
footprint BG126-05-A-1-N (SIL Female 2.54mm Bottom Entry)
pins: 1, 2, 3, 4, 5

## BG126-06-A-1-N-H
designator P?
Header SIL Female 2.54mm Bottom Entry; Manufacturer: GCT; Package: BG126-06-A-1-N-H; EDM-PN: *; Text2: *; Text1: *; Value: BG126-06-A-1-N-H; SAAB PN: *; Part Number: BG126-06-A-1-N-H
footprint BG126-06-A-1-N (SIL Female 2.54mm Bottom Entry)
pins: 1, 2, 3, 4, 5, 6

## BG126-07-A-1-N-H
designator P?
Header SIL Female 2.54mm Bottom Entry; Manufacturer: GCT; Package: BG126-07-A-1-N-H; EDM-PN: *; Text2: *; Text1: *; Value: BG126-07-A-1-N-H; SAAB PN: *; Part Number: BG126-07-A-1-N-H
footprint BG126-07-A-1-N (SIL Female 2.54mm Bottom Entry)
pins: 1, 2, 3, 4, 5, 6, 7

## BG126-08-A-1-N-D
designator P?
Header SIL Female 2.54mm Bottom Entry; Manufacturer: GCT; Package: BG126-08-A-1-N; EDM-PN: *; Text2: *; Text1: *; Value: BG126-08-A-1-N-D; SAAB PN: *; Part Number: BG126-08-A-1-N-D
footprint BG126-08-A-1-N (SIL Female 2.54mm Bottom Entry)
pins: 1, 2, 3, 4, 5, 6, 7, 8

## BG126-09-A-1-N-D
designator P?
Header SIL Female 2.54mm Bottom Entry; Manufacturer: GCT; Package: BG126-09-A-1-N; EDM-PN: *; Text2: *; Text1: *; Value: BG126-09-A-1-N-D; SAAB PN: *; Part Number: BG126-09-A-1-N-D
footprint BG126-09-A-1-N (SIL Female 2.54mm Bottom Entry)
pins: 1, 2, 3, 4, 5, 6, 7, 8, 9

## BG126-10-A-1-N-D
designator P?
Header SIL Female 2.54mm Bottom Entry; Manufacturer: GCT; Package: BG126-10-A-1-N; EDM-PN: *; Text2: *; Text1: *; Value: BG126-10-A-1-N-D; SAAB PN: *; Part Number: BG126-10-A-1-N-D
footprint BG126-10-A-1-N (SIL Female 2.54mm Bottom Entry)
pins: 1, 2, 3, 4, 5, 6, 7, 8, 9, 10

## BG126-15-A-1-N-D
designator P?
Header SIL Female 2.54mm Bottom Entry; Manufacturer: GCT; Package: BG126-15-A-1-N; EDM-PN: *; Text2: *; Text1: *; Value: BG126-15-A-1-N-D; SAAB PN: *; Part Number: BG126-15-A-1-N-D
footprint BG126-15-A-1-N (SIL Female 2.54mm Bottom Entry)
pins: 1, 2, 3, 4, 5, 6, 7, 8, 9, 10, 11, 12, 13, 14, 15

## BSW-102-04-L-S
designator P?
Socket Strip Bottom Mount; Manufacturer: Samtec; Package: BSW-102-x-x-S; EDM-PN: *; Text2: *; Text1: *; Part Number: BSW-102-04-L-S; SAAB PN: *; Value: BSW-102-04-L-S
footprint BSW-102-x-x-S (BSW-102 5.08x5.08mm)
pins: 1, 2

## CES-102-02-T-S-RA
designator P?
Header SIL Female THP, 2.54mm Pitch Rt Angle; Manufacturer: Samtec; Package: SIL2SR-2.54; EDM-PN: *; Text2: *; Text1: *; Value: CES-102-02-T-S-RA; SAAB PN: *; Part Number: CES-102-02-T-S-RA
footprint SIL2SR-2.54 (SIL Strip Female 7.63x8.08mm 2.54mm)
pins: 1, 2

## CES-103-02-T-S-RA
designator P?
Header SIL Female THP, 2.54mm Pitch Rt Angle; Manufacturer: Samtec; Package: SIL3SR-2.54; EDM-PN: *; Text2: *; Text1: *; Value: CES-103-02-T-S-RA; SAAB PN: *; Part Number: CES-103-02-T-S-RA
footprint SIL3SR-2.54 (SIL Strip Female 7.63x8.08mm 2.54mm)
pins: 1, 2, 3

## CES-106-01-L-S
designator P?
Socket SIL Male THP, 2.54mm Pitch; Manufacturer: Samtec; Package: CES-106-01-L-S; EDM-PN: *; Text2: *; Text1: *; Value: CES-106-01-L-S; SAAB PN: *; Part Number: CES-106-01-L-S
footprint CES-106-L-S (CES-106-L-S 2.54mm)
pins: 1, 2, 3, 4, 5, 6

## CES-106-01-T-S
designator P?
Socket SIL Male THP, 2.54mm Pitch; Manufacturer: Samtec; Package: CES-106-01-T-S; EDM-PN: *; Text2: *; Text1: *; Value: CES-106-01-T-S; Part Number: CES-106-01-T-S; SAAB PN: *
footprint CES-106-L-S (CES-106-L-S 2.54mm)
pins: 1, 2, 3, 4, 5, 6

## CES-112-01-L-S
designator P?
Socket SIL Male THP, 2.54mm Pitch; Manufacturer: Samtec; EDM-PN: CON1820; Package: CES-112-01-L-S; Text2: *; Text1: *; Value: CES-112-01-L-S; SAAB PN: *; Part Number: CES-112-01-L-S
footprint CES-112-01-L-S (CES-112-01-L-S 2.54mm)
pins: 1, 2, 3, 4, 5, 6, 7, 8, 9, 10, 11, 12

## DG333J-3.5-02P-13-00A(H)
designator P?
Pin Strip, 3.5mm Pitch; Manufacturer: Degson; Package: DG333J-3.5-02P-13-00A(H); EDM-PN: *; Text2: *; Text1: *; Value: DG333J-3.5-02P-13-00A(H); SAAB PN: *; Part Number: DG333J-3.5-02P-13-00A(H)
footprint DG333J-3.5-02P-13-00A(H) (Pin Strip, 3.5mm Pitch)
pins: 1, 2

## DG333J-3.5-02P-13-00A(H)+DG333K-3.5-02P-12-00A(H)
designator P?  Text2: DG333K-3.5-02P-12-00A(H)  Text1: DG333J-3.5-02P-13-00A(H)  (hidden comment: DG333J-3.5-02P-13-00A(H)+DG333K-3.5-02P-12-00A(H))
PIN Strip and Terminal block 3.5mm Pitch; Manufacturer: Degson; Value: DG333J-3.5-02P-13-00A(H)/DG333K-3.5-02P-12-00A(H); Package: DG333J-3.5-02P-13-00A(H)/DG333K-3.5-02P-12-00A(H); EDM-PN: *; Part Number: DG333J-3.5-02P-13-00A(H)+DG333K-3.5-02P-12-00A(H); SAAB PN: *
footprint DG333J-3.5-02P-13-00A(H)/DG333K-3.5-02P-12-00A(H) (Pin Strip, 3.5mm Pitch)
pins: 1, 2

## DG333J-3.5-03P-13-00A(H)
designator P?
Pin Strip, 3.5mm Pitch; Manufacturer: Degson; Package: DG333J-3.5-03P-13-00A(H); EDM-PN: *; Text2: *; Text1: *; Value: DG333J-3.5-03P-13-00A(H); Part Number: DG333J-3.5-03P-13-00A(H); SAAB PN: *
footprint DG333J-3.5-03P-13-00A(H) (Pin Strip, 3.5mm Pitch)
pins: 1, 2, 3
